# Altium footprint library CONN_HDR_2.54MM_RA.PcbLib: 63 footprints (part 4 of 5) (continued)
## HDRR_M_2X14 [mm] "Connector; Header; 14x2 Position"
height 7
pads (28):
  round 1.4 / inner round 1.4 / far side oval 1.4x2.2 hole 1: 1(-16.51,-1.27) 2(-16.51,1.27) 3(-13.97,-1.27) 4(-13.97,1.27) 5(-11.43,-1.27) 6(-11.43,1.27) 7(-8.89,-1.27) 8(-8.89,1.27) 9(-6.35,-1.27) 10(-6.35,1.27) 11(-3.81,-1.27) 12(-3.81,1.27) 13(-1.27,-1.27) 14(-1.27,1.27) 15(1.27,-1.27) 16(1.27,1.27) 17(3.81,-1.27) 18(3.81,1.27) 19(6.35,-1.27) 20(6.35,1.27) 21(8.89,-1.27) 22(8.89,1.27) 23(11.43,-1.27) 24(11.43,1.27) 25(13.97,-1.27) 26(13.97,1.27) 27(16.51,-1.27) 28(16.51,1.27)
Top Overlay:
  circle w0.2: c-18.34,-1.04 r0.2
  lines w0.2: -16.933,-5.31 -16.933,-13.197 -16.51,-13.62 -16.087,-13.197 -16.087,-5.31 ; -15.24,-5.31 -12.67,-5.31 ; -15.24,-2.7 -12.67,-2.7 ; -15.21,-5.31 -17.78,-5.31 -17.78,-2.7 -15.21,-2.7 ; -14.393,-5.31 -14.393,-13.197 -13.97,-13.62 -13.547,-13.197 -13.547,-5.31 ; -12.7,-5.31 -10.13,-5.31 ; -12.7,-2.7 -10.13,-2.7 ; -11.853,-5.31 -11.853,-13.197 -11.43,-13.62 -11.007,-13.197 -11.007,-5.31 ; -10.16,-5.31 -7.59,-5.31 ; -10.16,-2.7 -7.59,-2.7 ; -9.313,-5.31 -9.313,-13.197 -8.89,-13.62 -8.467,-13.197 -8.467,-5.31 ; -7.62,-5.31 -5.05,-5.31 ; -7.62,-2.7 -5.05,-2.7 ; -6.773,-5.31 -6.773,-13.197 -6.35,-13.62 -5.927,-13.197 -5.927,-5.31 ; -5.08,-5.31 -2.51,-5.31 ; -5.08,-2.7 -2.51,-2.7 ; -4.233,-5.31 -4.233,-13.197 -3.81,-13.62 -3.387,-13.197 -3.387,-5.31 ; -2.54,-5.31 0.03,-5.31 ; -2.54,-2.7 0.03,-2.7 ; -1.693,-5.31 -1.693,-13.197 -1.27,-13.62 -0.847,-13.197 -0.847,-5.31 ; 0,-5.31 2.57,-5.31 ; 0,-2.7 2.57,-2.7 ; 0.847,-5.31 0.847,-13.197 1.27,-13.62 1.693,-13.197 1.693,-5.31 ; 2.54,-5.31 5.11,-5.31 ; 2.54,-2.7 5.11,-2.7 ; 3.387,-5.31 3.387,-13.197 3.81,-13.62 4.233,-13.197 4.233,-5.31 ; 5.08,-5.31 7.65,-5.31 ; 5.08,-2.7 7.65,-2.7 ; 5.927,-5.31 5.927,-13.197 6.35,-13.62 6.773,-13.197 6.773,-5.31 ; 7.62,-5.31 10.19,-5.31 ; 7.62,-2.7 10.19,-2.7 ; 8.467,-5.31 8.467,-13.197 8.89,-13.62 9.313,-13.197 9.313,-5.31 ; 10.16,-5.31 12.73,-5.31 ; 10.16,-2.7 12.73,-2.7 ; 11.007,-5.31 11.007,-13.197 11.43,-13.62 11.853,-13.197 11.853,-5.31 ; 12.7,-5.31 15.27,-5.31 ; 12.7,-2.7 15.27,-2.7 ; 13.547,-5.31 13.547,-13.197 13.97,-13.62 14.393,-13.197 14.393,-5.31 ; 15.24,-5.31 17.81,-5.31 17.81,-2.7 15.24,-2.7 ; 16.087,-5.31 16.087,-13.197 16.51,-13.62 16.933,-13.197 16.933,-5.31
3D body "2x1 Male Pin Header Angle.STEP": height 5.04, standoff -2.96, extent -17.785,-13.34 -15.24,1.56
3D body "2x1 Male Pin Header Angle.STEP": height 5.04, standoff -2.96, extent -15.245,-13.34 -12.7,1.56
3D body "2x1 Male Pin Header Angle.STEP": height 5.04, standoff -2.96, extent -12.705,-13.34 -10.16,1.56
3D body "2x1 Male Pin Header Angle.STEP": height 5.04, standoff -2.96, extent -10.165,-13.34 -7.62,1.56
3D body "2x1 Male Pin Header Angle.STEP": height 5.04, standoff -2.96, extent -7.625,-13.34 -5.08,1.56
3D body "2x1 Male Pin Header Angle.STEP": height 5.04, standoff -2.96, extent -5.085,-13.34 -2.54,1.56
3D body "2x1 Male Pin Header Angle.STEP": height 5.04, standoff -2.96, extent -2.545,-13.34 0,1.56
3D body "2x1 Male Pin Header Angle.STEP": height 5.04, standoff -2.96, extent -0.005,-13.34 2.54,1.56
3D body "2x1 Male Pin Header Angle.STEP": height 5.04, standoff -2.96, extent 2.535,-13.34 5.08,1.56
3D body "2x1 Male Pin Header Angle.STEP": height 5.04, standoff -2.96, extent 5.075,-13.34 7.62,1.56
3D body "2x1 Male Pin Header Angle.STEP": height 5.04, standoff -2.96, extent 7.615,-13.34 10.16,1.56
3D body "2x1 Male Pin Header Angle.STEP": height 5.04, standoff -2.96, extent 10.155,-13.34 12.7,1.56
3D body "2x1 Male Pin Header Angle.STEP": height 5.04, standoff -2.96, extent 12.695,-13.34 15.24,1.56
3D body "2x1 Male Pin Header Angle.STEP": height 5.04, standoff -2.96, extent 15.235,-13.34 17.78,1.56

## HDRR_M_2X15 [mm] "Connector; Header; 15x2 Position"
height 0.001
pads (30):
  round 1.4 / inner round 1.4 / far side oval 1.4x2.2 hole 1: 1(-17.78,-1.27) 2(-17.78,1.27) 3(-15.24,-1.27) 4(-15.24,1.27) 5(-12.7,-1.27) 6(-12.7,1.27) 7(-10.16,-1.27) 8(-10.16,1.27) 9(-7.62,-1.27) 10(-7.62,1.27) 11(-5.08,-1.27) 12(-5.08,1.27) 13(-2.54,-1.27) 14(-2.54,1.27) 15(0,-1.27) 16(0,1.27) 17(2.54,-1.27) 18(2.54,1.27) 19(5.08,-1.27) 20(5.08,1.27) 21(7.62,-1.27) 22(7.62,1.27) 23(10.16,-1.27) 24(10.16,1.27) 25(12.7,-1.27) 26(12.7,1.27) 27(15.24,-1.27) 28(15.24,1.27) 29(17.78,-1.27) 30(17.78,1.27)
Top Overlay:
  circle w0.2: c-19.61,-1.04 r0.2
  lines w0.2: -18.203,-5.31 -18.203,-13.197 -17.78,-13.62 -17.357,-13.197 -17.357,-5.31 ; -16.51,-5.31 -13.94,-5.31 ; -16.51,-2.7 -13.94,-2.7 ; -16.48,-5.31 -19.05,-5.31 -19.05,-2.7 -16.48,-2.7 ; -15.663,-5.31 -15.663,-13.197 -15.24,-13.62 -14.817,-13.197 -14.817,-5.31 ; -13.97,-5.31 -11.4,-5.31 ; -13.97,-2.7 -11.4,-2.7 ; -13.123,-5.31 -13.123,-13.197 -12.7,-13.62 -12.277,-13.197 -12.277,-5.31 ; -11.43,-5.31 -8.86,-5.31 ; -11.43,-2.7 -8.86,-2.7 ; -10.583,-5.31 -10.583,-13.197 -10.16,-13.62 -9.737,-13.197 -9.737,-5.31 ; -8.89,-5.31 -6.32,-5.31 ; -8.89,-2.7 -6.32,-2.7 ; -8.043,-5.31 -8.043,-13.197 -7.62,-13.62 -7.197,-13.197 -7.197,-5.31 ; -6.35,-5.31 -3.78,-5.31 ; -6.35,-2.7 -3.78,-2.7 ; -5.503,-5.31 -5.503,-13.197 -5.08,-13.62 -4.657,-13.197 -4.657,-5.31 ; -3.81,-5.31 -1.24,-5.31 ; -3.81,-2.7 -1.24,-2.7 ; -2.963,-5.31 -2.963,-13.197 -2.54,-13.62 -2.117,-13.197 -2.117,-5.31 ; -1.27,-5.31 1.3,-5.31 ; -1.27,-2.7 1.3,-2.7 ; -0.423,-5.31 -0.423,-13.197 0,-13.62 0.423,-13.197 0.423,-5.31 ; 1.27,-5.31 3.84,-5.31 ; 1.27,-2.7 3.84,-2.7 ; 2.117,-5.31 2.117,-13.197 2.54,-13.62 2.963,-13.197 2.963,-5.31 ; 3.81,-5.31 6.38,-5.31 ; 3.81,-2.7 6.38,-2.7 ; 4.657,-5.31 4.657,-13.197 5.08,-13.62 5.503,-13.197 5.503,-5.31 ; 6.35,-5.31 8.92,-5.31 ; 6.35,-2.7 8.92,-2.7 ; 7.197,-5.31 7.197,-13.197 7.62,-13.62 8.043,-13.197 8.043,-5.31 ; 8.89,-5.31 11.46,-5.31 ; 8.89,-2.7 11.46,-2.7 ; 9.737,-5.31 9.737,-13.197 10.16,-13.62 10.583,-13.197 10.583,-5.31 ; 11.43,-5.31 14,-5.31 ; 11.43,-2.7 14,-2.7 ; 12.277,-5.31 12.277,-13.197 12.7,-13.62 13.123,-13.197 13.123,-5.31 ; 13.97,-5.31 16.54,-5.31 ; 13.97,-2.7 16.54,-2.7 ; 14.817,-5.31 14.817,-13.197 15.24,-13.62 15.663,-13.197 15.663,-5.31 ; 16.51,-5.31 19.08,-5.31 19.08,-2.7 16.51,-2.7 ; 17.357,-5.31 17.357,-13.197 17.78,-13.62 18.203,-13.197 18.203,-5.31
3D body "2x1 Male Pin Header Angle.STEP": height 5.04, standoff -2.96, extent -19.055,-13.34 -16.51,1.56
3D body "2x1 Male Pin Header Angle.STEP": height 5.04, standoff -2.96, extent -16.515,-13.34 -13.97,1.56
3D body "2x1 Male Pin Header Angle.STEP": height 5.04, standoff -2.96, extent -13.975,-13.34 -11.43,1.56
3D body "2x1 Male Pin Header Angle.STEP": height 5.04, standoff -2.96, extent -11.435,-13.34 -8.89,1.56
3D body "2x1 Male Pin Header Angle.STEP": height 5.04, standoff -2.96, extent -8.895,-13.34 -6.35,1.56
3D body "2x1 Male Pin Header Angle.STEP": height 5.04, standoff -2.96, extent -6.355,-13.34 -3.81,1.56
3D body "2x1 Male Pin Header Angle.STEP": height 5.04, standoff -2.96, extent -3.815,-13.34 -1.27,1.56
3D body "2x1 Male Pin Header Angle.STEP": height 5.04, standoff -2.96, extent -1.275,-13.34 1.27,1.56
3D body "2x1 Male Pin Header Angle.STEP": height 5.04, standoff -2.96, extent 1.265,-13.34 3.81,1.56
3D body "2x1 Male Pin Header Angle.STEP": height 5.04, standoff -2.96, extent 3.805,-13.34 6.35,1.56
3D body "2x1 Male Pin Header Angle.STEP": height 5.04, standoff -2.96, extent 6.345,-13.34 8.89,1.56
3D body "2x1 Male Pin Header Angle.STEP": height 5.04, standoff -2.96, extent 8.885,-13.34 11.43,1.56
3D body "2x1 Male Pin Header Angle.STEP": height 5.04, standoff -2.96, extent 11.425,-13.34 13.97,1.56
3D body "2x1 Male Pin Header Angle.STEP": height 5.04, standoff -2.96, extent 13.965,-13.34 16.51,1.56
3D body "2x1 Male Pin Header Angle.STEP": height 5.04, standoff -2.96, extent 16.505,-13.34 19.05,1.56

## HDRR_M_2X16 [mm] "Connector; Header; 16x2 Position"
height 7
pads (32):
  round 1.4 / inner round 1.4 / far side oval 1.4x2.2 hole 1: 1(-19.05,-1.27) 2(-19.05,1.27) 3(-16.51,-1.27) 4(-16.51,1.27) 5(-13.97,-1.27) 6(-13.97,1.27) 7(-11.43,-1.27) 8(-11.43,1.27) 9(-8.89,-1.27) 10(-8.89,1.27) 11(-6.35,-1.27) 12(-6.35,1.27) 13(-3.81,-1.27) 14(-3.81,1.27) 15(-1.27,-1.27) 16(-1.27,1.27) 17(1.27,-1.27) 18(1.27,1.27) 19(3.81,-1.27) 20(3.81,1.27) 21(6.35,-1.27) 22(6.35,1.27) 23(8.89,-1.27) 24(8.89,1.27) 25(11.43,-1.27) 26(11.43,1.27) 27(13.97,-1.27) 28(13.97,1.27) 29(16.51,-1.27) 30(16.51,1.27) 31(19.05,-1.27) 32(19.05,1.27)
Top Overlay:
  circle w0.2: c-20.88,-1.04 r0.2
  lines w0.2: -19.473,-5.31 -19.473,-13.197 -19.05,-13.62 -18.627,-13.197 -18.627,-5.31 ; -17.78,-5.31 -15.21,-5.31 ; -17.78,-2.7 -15.21,-2.7 ; -17.75,-5.31 -20.32,-5.31 -20.32,-2.7 -17.75,-2.7 ; -16.933,-5.31 -16.933,-13.197 -16.51,-13.62 -16.087,-13.197 -16.087,-5.31 ; -15.24,-5.31 -12.67,-5.31 ; -15.24,-2.7 -12.67,-2.7 ; -14.393,-5.31 -14.393,-13.197 -13.97,-13.62 -13.547,-13.197 -13.547,-5.31 ; -12.7,-5.31 -10.13,-5.31 ; -12.7,-2.7 -10.13,-2.7 ; -11.853,-5.31 -11.853,-13.197 -11.43,-13.62 -11.007,-13.197 -11.007,-5.31 ; -10.16,-5.31 -7.59,-5.31 ; -10.16,-2.7 -7.59,-2.7 ; -9.313,-5.31 -9.313,-13.197 -8.89,-13.62 -8.467,-13.197 -8.467,-5.31 ; -7.62,-5.31 -5.05,-5.31 ; -7.62,-2.7 -5.05,-2.7 ; -6.773,-5.31 -6.773,-13.197 -6.35,-13.62 -5.927,-13.197 -5.927,-5.31 ; -5.08,-5.31 -2.51,-5.31 ; -5.08,-2.7 -2.51,-2.7 ; -4.233,-5.31 -4.233,-13.197 -3.81,-13.62 -3.387,-13.197 -3.387,-5.31 ; -2.54,-5.31 0.03,-5.31 ; -2.54,-2.7 0.03,-2.7 ; -1.693,-5.31 -1.693,-13.197 -1.27,-13.62 -0.847,-13.197 -0.847,-5.31 ; 0,-5.31 2.57,-5.31 ; 0,-2.7 2.57,-2.7 ; 0.847,-5.31 0.847,-13.197 1.27,-13.62 1.693,-13.197 1.693,-5.31 ; 2.54,-5.31 5.11,-5.31 ; 2.54,-2.7 5.11,-2.7 ; 3.387,-5.31 3.387,-13.197 3.81,-13.62 4.233,-13.197 4.233,-5.31 ; 5.08,-5.31 7.65,-5.31 ; 5.08,-2.7 7.65,-2.7 ; 5.927,-5.31 5.927,-13.197 6.35,-13.62 6.773,-13.197 6.773,-5.31 ; 7.62,-5.31 10.19,-5.31 ; 7.62,-2.7 10.19,-2.7 ; 8.467,-5.31 8.467,-13.197 8.89,-13.62 9.313,-13.197 9.313,-5.31 ; 10.16,-5.31 12.73,-5.31 ; 10.16,-2.7 12.73,-2.7 ; 11.007,-5.31 11.007,-13.197 11.43,-13.62 11.853,-13.197 11.853,-5.31 ; 12.7,-5.31 15.27,-5.31 ; 12.7,-2.7 15.27,-2.7 ; 13.547,-5.31 13.547,-13.197 13.97,-13.62 14.393,-13.197 14.393,-5.31 ; 15.24,-5.31 17.81,-5.31 ; 15.24,-2.7 17.81,-2.7 ; 16.087,-5.31 16.087,-13.197 16.51,-13.62 16.933,-13.197 16.933,-5.31 ; 17.78,-5.31 20.35,-5.31 20.35,-2.7 17.78,-2.7 ; 18.627,-5.31 18.627,-13.197 19.05,-13.62 19.473,-13.197 19.473,-5.31
3D body "2x1 Male Pin Header Angle.STEP": height 5.04, standoff -2.96, extent -20.325,-13.34 -17.78,1.56
3D body "2x1 Male Pin Header Angle.STEP": height 5.04, standoff -2.96, extent -17.785,-13.34 -15.24,1.56
3D body "2x1 Male Pin Header Angle.STEP": height 5.04, standoff -2.96, extent -15.245,-13.34 -12.7,1.56
3D body "2x1 Male Pin Header Angle.STEP": height 5.04, standoff -2.96, extent -12.705,-13.34 -10.16,1.56
3D body "2x1 Male Pin Header Angle.STEP": height 5.04, standoff -2.96, extent -10.165,-13.34 -7.62,1.56
3D body "2x1 Male Pin Header Angle.STEP": height 5.04, standoff -2.96, extent -7.625,-13.34 -5.08,1.56
3D body "2x1 Male Pin Header Angle.STEP": height 5.04, standoff -2.96, extent -5.085,-13.34 -2.54,1.56
3D body "2x1 Male Pin Header Angle.STEP": height 5.04, standoff -2.96, extent -2.545,-13.34 0,1.56
3D body "2x1 Male Pin Header Angle.STEP": height 5.04, standoff -2.96, extent -0.005,-13.34 2.54,1.56
3D body "2x1 Male Pin Header Angle.STEP": height 5.04, standoff -2.96, extent 2.535,-13.34 5.08,1.56
3D body "2x1 Male Pin Header Angle.STEP": height 5.04, standoff -2.96, extent 5.075,-13.34 7.62,1.56
3D body "2x1 Male Pin Header Angle.STEP": height 5.04, standoff -2.96, extent 7.615,-13.34 10.16,1.56
3D body "2x1 Male Pin Header Angle.STEP": height 5.04, standoff -2.96, extent 10.155,-13.34 12.7,1.56
3D body "2x1 Male Pin Header Angle.STEP": height 5.04, standoff -2.96, extent 12.695,-13.34 15.24,1.56
3D body "2x1 Male Pin Header Angle.STEP": height 5.04, standoff -2.96, extent 15.235,-13.34 17.78,1.56
3D body "2x1 Male Pin Header Angle.STEP": height 5.04, standoff -2.96, extent 17.775,-13.34 20.32,1.56

## HDRR_M_2X17 [mm] "Connector; Header; 17x2 Position"
height 7
pads (34):
  round 1.4 / inner round 1.4 / far side oval 1.4x2.2 hole 1: 1(-20.32,-1.27) 2(-20.32,1.27) 3(-17.78,-1.27) 4(-17.78,1.27) 5(-15.24,-1.27) 6(-15.24,1.27) 7(-12.7,-1.27) 8(-12.7,1.27) 9(-10.16,-1.27) 10(-10.16,1.27) 11(-7.62,-1.27) 12(-7.62,1.27) 13(-5.08,-1.27) 14(-5.08,1.27) 15(-2.54,-1.27) 16(-2.54,1.27) 17(0,-1.27) 18(0,1.27) 19(2.54,-1.27) 20(2.54,1.27) 21(5.08,-1.27) 22(5.08,1.27) 23(7.62,-1.27) 24(7.62,1.27) 25(10.16,-1.27) 26(10.16,1.27) 27(12.7,-1.27) 28(12.7,1.27) 29(15.24,-1.27) 30(15.24,1.27) 31(17.78,-1.27) 32(17.78,1.27) 33(20.32,-1.27) 34(20.32,1.27)
Top Overlay:
  circle w0.2: c-22.15,-1.04 r0.2
  lines w0.2: -20.743,-5.31 -20.743,-13.197 -20.32,-13.62 -19.897,-13.197 -19.897,-5.31 ; -19.05,-5.31 -16.48,-5.31 ; -19.05,-2.7 -16.48,-2.7 ; -19.02,-5.31 -21.59,-5.31 -21.59,-2.7 -19.02,-2.7 ; -18.203,-5.31 -18.203,-13.197 -17.78,-13.62 -17.357,-13.197 -17.357,-5.31 ; -16.51,-5.31 -13.94,-5.31 ; -16.51,-2.7 -13.94,-2.7 ; -15.663,-5.31 -15.663,-13.197 -15.24,-13.62 -14.817,-13.197 -14.817,-5.31 ; -13.97,-5.31 -11.4,-5.31 ; -13.97,-2.7 -11.4,-2.7 ; -13.123,-5.31 -13.123,-13.197 -12.7,-13.62 -12.277,-13.197 -12.277,-5.31 ; -11.43,-5.31 -8.86,-5.31 ; -11.43,-2.7 -8.86,-2.7 ; -10.583,-5.31 -10.583,-13.197 -10.16,-13.62 -9.737,-13.197 -9.737,-5.31 ; -8.89,-5.31 -6.32,-5.31 ; -8.89,-2.7 -6.32,-2.7 ; -8.043,-5.31 -8.043,-13.197 -7.62,-13.62 -7.197,-13.197 -7.197,-5.31 ; -6.35,-5.31 -3.78,-5.31 ; -6.35,-2.7 -3.78,-2.7 ; -5.503,-5.31 -5.503,-13.197 -5.08,-13.62 -4.657,-13.197 -4.657,-5.31 ; -3.81,-5.31 -1.24,-5.31 ; -3.81,-2.7 -1.24,-2.7 ; -2.963,-5.31 -2.963,-13.197 -2.54,-13.62 -2.117,-13.197 -2.117,-5.31 ; -1.27,-5.31 1.3,-5.31 ; -1.27,-2.7 1.3,-2.7 ; -0.423,-5.31 -0.423,-13.197 0,-13.62 0.423,-13.197 0.423,-5.31 ; 1.27,-5.31 3.84,-5.31 ; 1.27,-2.7 3.84,-2.7 ; 2.117,-5.31 2.117,-13.197 2.54,-13.62 2.963,-13.197 2.963,-5.31 ; 3.81,-5.31 6.38,-5.31 ; 3.81,-2.7 6.38,-2.7 ; 4.657,-5.31 4.657,-13.197 5.08,-13.62 5.503,-13.197 5.503,-5.31 ; 6.35,-5.31 8.92,-5.31 ; 6.35,-2.7 8.92,-2.7 ; 7.197,-5.31 7.197,-13.197 7.62,-13.62 8.043,-13.197 8.043,-5.31 ; 8.89,-5.31 11.46,-5.31 ; 8.89,-2.7 11.46,-2.7 ; 9.737,-5.31 9.737,-13.197 10.16,-13.62 10.583,-13.197 10.583,-5.31 ; 11.43,-5.31 14,-5.31 ; 11.43,-2.7 14,-2.7 ; 12.277,-5.31 12.277,-13.197 12.7,-13.62 13.123,-13.197 13.123,-5.31 ; 13.97,-5.31 16.54,-5.31 ; 13.97,-2.7 16.54,-2.7 ; 14.817,-5.31 14.817,-13.197 15.24,-13.62 15.663,-13.197 15.663,-5.31 ; 16.51,-5.31 19.08,-5.31 ; 16.51,-2.7 19.08,-2.7 ; 17.357,-5.31 17.357,-13.197 17.78,-13.62 18.203,-13.197 18.203,-5.31 ; 19.05,-5.31 21.62,-5.31 21.62,-2.7 19.05,-2.7 ; 19.897,-5.31 19.897,-13.197 20.32,-13.62 20.743,-13.197 20.743,-5.31
3D body "2x1 Male Pin Header Angle.STEP": height 5.04, standoff -2.96, extent -21.595,-13.34 -19.05,1.56
3D body "2x1 Male Pin Header Angle.STEP": height 5.04, standoff -2.96, extent -19.055,-13.34 -16.51,1.56
3D body "2x1 Male Pin Header Angle.STEP": height 5.04, standoff -2.96, extent -16.515,-13.34 -13.97,1.56
3D body "2x1 Male Pin Header Angle.STEP": height 5.04, standoff -2.96, extent -13.975,-13.34 -11.43,1.56
3D body "2x1 Male Pin Header Angle.STEP": height 5.04, standoff -2.96, extent -11.435,-13.34 -8.89,1.56
3D body "2x1 Male Pin Header Angle.STEP": height 5.04, standoff -2.96, extent -8.895,-13.34 -6.35,1.56
3D body "2x1 Male Pin Header Angle.STEP": height 5.04, standoff -2.96, extent -6.355,-13.34 -3.81,1.56
3D body "2x1 Male Pin Header Angle.STEP": height 5.04, standoff -2.96, extent -3.815,-13.34 -1.27,1.56
3D body "2x1 Male Pin Header Angle.STEP": height 5.04, standoff -2.96, extent -1.275,-13.34 1.27,1.56
3D body "2x1 Male Pin Header Angle.STEP": height 5.04, standoff -2.96, extent 1.265,-13.34 3.81,1.56
3D body "2x1 Male Pin Header Angle.STEP": height 5.04, standoff -2.96, extent 3.805,-13.34 6.35,1.56
3D body "2x1 Male Pin Header Angle.STEP": height 5.04, standoff -2.96, extent 6.345,-13.34 8.89,1.56
3D body "2x1 Male Pin Header Angle.STEP": height 5.04, standoff -2.96, extent 8.885,-13.34 11.43,1.56
3D body "2x1 Male Pin Header Angle.STEP": height 5.04, standoff -2.96, extent 11.425,-13.34 13.97,1.56
3D body "2x1 Male Pin Header Angle.STEP": height 5.04, standoff -2.96, extent 13.965,-13.34 16.51,1.56
3D body "2x1 Male Pin Header Angle.STEP": height 5.04, standoff -2.96, extent 16.505,-13.34 19.05,1.56
3D body "2x1 Male Pin Header Angle.STEP": height 5.04, standoff -2.96, extent 19.045,-13.34 21.59,1.56

## HDRR_M_2X18 [mm] "Connector; Header; 18x2 Position"
height 7
pads (36):
  round 1.4 / inner round 1.4 / far side oval 1.4x2.2 hole 1: 1(-21.59,-1.27) 2(-21.59,1.27) 3(-19.05,-1.27) 4(-19.05,1.27) 5(-16.51,-1.27) 6(-16.51,1.27) 7(-13.97,-1.27) 8(-13.97,1.27) 9(-11.43,-1.27) 10(-11.43,1.27) 11(-8.89,-1.27) 12(-8.89,1.27) 13(-6.35,-1.27) 14(-6.35,1.27) 15(-3.81,-1.27) 16(-3.81,1.27) 17(-1.27,-1.27) 18(-1.27,1.27) 19(1.27,-1.27) 20(1.27,1.27) 21(3.81,-1.27) 22(3.81,1.27) 23(6.35,-1.27) 24(6.35,1.27) 25(8.89,-1.27) 26(8.89,1.27) 27(11.43,-1.27) 28(11.43,1.27) 29(13.97,-1.27) 30(13.97,1.27) 31(16.51,-1.27) 32(16.51,1.27) 33(19.05,-1.27) 34(19.05,1.27) 35(21.59,-1.27) 36(21.59,1.27)
Top Overlay:
  circle w0.2: c-23.42,-1.04 r0.2
  lines w0.2: -22.013,-5.31 -22.013,-13.197 -21.59,-13.62 -21.167,-13.197 -21.167,-5.31 ; -20.32,-5.31 -17.75,-5.31 ; -20.32,-2.7 -17.75,-2.7 ; -20.29,-5.31 -22.86,-5.31 -22.86,-2.7 -20.29,-2.7 ; -19.473,-5.31 -19.473,-13.197 -19.05,-13.62 -18.627,-13.197 -18.627,-5.31 ; -17.78,-5.31 -15.21,-5.31 ; -17.78,-2.7 -15.21,-2.7 ; -16.933,-5.31 -16.933,-13.197 -16.51,-13.62 -16.087,-13.197 -16.087,-5.31 ; -15.24,-5.31 -12.67,-5.31 ; -15.24,-2.7 -12.67,-2.7 ; -14.393,-5.31 -14.393,-13.197 -13.97,-13.62 -13.547,-13.197 -13.547,-5.31 ; -12.7,-5.31 -10.13,-5.31 ; -12.7,-2.7 -10.13,-2.7 ; -11.853,-5.31 -11.853,-13.197 -11.43,-13.62 -11.007,-13.197 -11.007,-5.31 ; -10.16,-5.31 -7.59,-5.31 ; -10.16,-2.7 -7.59,-2.7 ; -9.313,-5.31 -9.313,-13.197 -8.89,-13.62 -8.467,-13.197 -8.467,-5.31 ; -7.62,-5.31 -5.05,-5.31 ; -7.62,-2.7 -5.05,-2.7 ; -6.773,-5.31 -6.773,-13.197 -6.35,-13.62 -5.927,-13.197 -5.927,-5.31 ; -5.08,-5.31 -2.51,-5.31 ; -5.08,-2.7 -2.51,-2.7 ; -4.233,-5.31 -4.233,-13.197 -3.81,-13.62 -3.387,-13.197 -3.387,-5.31 ; -2.54,-5.31 0.03,-5.31 ; -2.54,-2.7 0.03,-2.7 ; -1.693,-5.31 -1.693,-13.197 -1.27,-13.62 -0.847,-13.197 -0.847,-5.31 ; 0,-5.31 2.57,-5.31 ; 0,-2.7 2.57,-2.7 ; 0.847,-5.31 0.847,-13.197 1.27,-13.62 1.693,-13.197 1.693,-5.31 ; 2.54,-5.31 5.11,-5.31 ; 2.54,-2.7 5.11,-2.7 ; 3.387,-5.31 3.387,-13.197 3.81,-13.62 4.233,-13.197 4.233,-5.31 ; 5.08,-5.31 7.65,-5.31 ; 5.08,-2.7 7.65,-2.7 ; 5.927,-5.31 5.927,-13.197 6.35,-13.62 6.773,-13.197 6.773,-5.31 ; 7.62,-5.31 10.19,-5.31 ; 7.62,-2.7 10.19,-2.7 ; 8.467,-5.31 8.467,-13.197 8.89,-13.62 9.313,-13.197 9.313,-5.31 ; 10.16,-5.31 12.73,-5.31 ; 10.16,-2.7 12.73,-2.7 ; 11.007,-5.31 11.007,-13.197 11.43,-13.62 11.853,-13.197 11.853,-5.31 ; 12.7,-5.31 15.27,-5.31 ; 12.7,-2.7 15.27,-2.7 ; 13.547,-5.31 13.547,-13.197 13.97,-13.62 14.393,-13.197 14.393,-5.31 ; 15.24,-5.31 17.81,-5.31 ; 15.24,-2.7 17.81,-2.7 ; 16.087,-5.31 16.087,-13.197 16.51,-13.62 16.933,-13.197 16.933,-5.31 ; 17.78,-5.31 20.35,-5.31 ; 17.78,-2.7 20.35,-2.7 ; 18.627,-5.31 18.627,-13.197 19.05,-13.62 19.473,-13.197 19.473,-5.31 ; 20.32,-5.31 22.89,-5.31 22.89,-2.7 20.32,-2.7 ; 21.167,-5.31 21.167,-13.197 21.59,-13.62 22.013,-13.197 22.013,-5.31
3D body "2x1 Male Pin Header Angle.STEP": height 5.04, standoff -2.96, extent 20.315,-13.34 22.86,1.56
3D body "2x1 Male Pin Header Angle.STEP": height 5.04, standoff -2.96, extent -22.865,-13.34 -20.32,1.56
3D body "2x1 Male Pin Header Angle.STEP": height 5.04, standoff -2.96, extent -20.325,-13.34 -17.78,1.56
3D body "2x1 Male Pin Header Angle.STEP": height 5.04, standoff -2.96, extent -17.785,-13.34 -15.24,1.56
3D body "2x1 Male Pin Header Angle.STEP": height 5.04, standoff -2.96, extent -15.245,-13.34 -12.7,1.56
3D body "2x1 Male Pin Header Angle.STEP": height 5.04, standoff -2.96, extent -12.705,-13.34 -10.16,1.56
3D body "2x1 Male Pin Header Angle.STEP": height 5.04, standoff -2.96, extent -10.165,-13.34 -7.62,1.56
3D body "2x1 Male Pin Header Angle.STEP": height 5.04, standoff -2.96, extent -7.625,-13.34 -5.08,1.56
3D body "2x1 Male Pin Header Angle.STEP": height 5.04, standoff -2.96, extent -5.085,-13.34 -2.54,1.56
3D body "2x1 Male Pin Header Angle.STEP": height 5.04, standoff -2.96, extent -2.545,-13.34 0,1.56
3D body "2x1 Male Pin Header Angle.STEP": height 5.04, standoff -2.96, extent -0.005,-13.34 2.54,1.56
3D body "2x1 Male Pin Header Angle.STEP": height 5.04, standoff -2.96, extent 2.535,-13.34 5.08,1.56
3D body "2x1 Male Pin Header Angle.STEP": height 5.04, standoff -2.96, extent 5.075,-13.34 7.62,1.56
3D body "2x1 Male Pin Header Angle.STEP": height 5.04, standoff -2.96, extent 7.615,-13.34 10.16,1.56
3D body "2x1 Male Pin Header Angle.STEP": height 5.04, standoff -2.96, extent 10.155,-13.34 12.7,1.56
3D body "2x1 Male Pin Header Angle.STEP": height 5.04, standoff -2.96, extent 12.695,-13.34 15.24,1.56
3D body "2x1 Male Pin Header Angle.STEP": height 5.04, standoff -2.96, extent 15.235,-13.34 17.78,1.56
3D body "2x1 Male Pin Header Angle.STEP": height 5.04, standoff -2.96, extent 17.775,-13.34 20.32,1.56

## HDRR_M_2X19 [mm] "Connector; Header; 19x2 Position"
height 7
pads (38):
  round 1.4 / inner round 1.4 / far side oval 1.4x2.2 hole 1: 1(-22.86,-1.27) 2(-22.86,1.27) 3(-20.32,-1.27) 4(-20.32,1.27) 5(-17.78,-1.27) 6(-17.78,1.27) 7(-15.24,-1.27) 8(-15.24,1.27) 9(-12.7,-1.27) 10(-12.7,1.27) 11(-10.16,-1.27) 12(-10.16,1.27) 13(-7.62,-1.27) 14(-7.62,1.27) 15(-5.08,-1.27) 16(-5.08,1.27) 17(-2.54,-1.27) 18(-2.54,1.27) 19(0,-1.27) 20(0,1.27) 21(2.54,-1.27) 22(2.54,1.27) 23(5.08,-1.27) 24(5.08,1.27) 25(7.62,-1.27) 26(7.62,1.27) 27(10.16,-1.27) 28(10.16,1.27) 29(12.7,-1.27) 30(12.7,1.27) 31(15.24,-1.27) 32(15.24,1.27) 33(17.78,-1.27) 34(17.78,1.27) 35(20.32,-1.27) 36(20.32,1.27) 37(22.86,-1.27) 38(22.86,1.27)
Top Overlay:
  circle w0.2: c-24.69,-1.04 r0.2
  lines w0.2: -23.283,-5.31 -23.283,-13.197 -22.86,-13.62 -22.437,-13.197 -22.437,-5.31 ; -21.59,-5.31 -19.02,-5.31 ; -21.59,-2.7 -19.02,-2.7 ; -21.56,-5.31 -24.13,-5.31 -24.13,-2.7 -21.56,-2.7 ; -20.743,-5.31 -20.743,-13.197 -20.32,-13.62 -19.897,-13.197 -19.897,-5.31 ; -19.05,-5.31 -16.48,-5.31 ; -19.05,-2.7 -16.48,-2.7 ; -18.203,-5.31 -18.203,-13.197 -17.78,-13.62 -17.357,-13.197 -17.357,-5.31 ; -16.51,-5.31 -13.94,-5.31 ; -16.51,-2.7 -13.94,-2.7 ; -15.663,-5.31 -15.663,-13.197 -15.24,-13.62 -14.817,-13.197 -14.817,-5.31 ; -13.97,-5.31 -11.4,-5.31 ; -13.97,-2.7 -11.4,-2.7 ; -13.123,-5.31 -13.123,-13.197 -12.7,-13.62 -12.277,-13.197 -12.277,-5.31 ; -11.43,-5.31 -8.86,-5.31 ; -11.43,-2.7 -8.86,-2.7 ; -10.583,-5.31 -10.583,-13.197 -10.16,-13.62 -9.737,-13.197 -9.737,-5.31 ; -8.89,-5.31 -6.32,-5.31 ; -8.89,-2.7 -6.32,-2.7 ; -8.043,-5.31 -8.043,-13.197 -7.62,-13.62 -7.197,-13.197 -7.197,-5.31 ; -6.35,-5.31 -3.78,-5.31 ; -6.35,-2.7 -3.78,-2.7 ; -5.503,-5.31 -5.503,-13.197 -5.08,-13.62 -4.657,-13.197 -4.657,-5.31 ; -3.81,-5.31 -1.24,-5.31 ; -3.81,-2.7 -1.24,-2.7 ; -2.963,-5.31 -2.963,-13.197 -2.54,-13.62 -2.117,-13.197 -2.117,-5.31 ; -1.27,-5.31 1.3,-5.31 ; -1.27,-2.7 1.3,-2.7 ; -0.423,-5.31 -0.423,-13.197 0,-13.62 0.423,-13.197 0.423,-5.31 ; 1.27,-5.31 3.84,-5.31 ; 1.27,-2.7 3.84,-2.7 ; 2.117,-5.31 2.117,-13.197 2.54,-13.62 2.963,-13.197 2.963,-5.31 ; 3.81,-5.31 6.38,-5.31 ; 3.81,-2.7 6.38,-2.7 ; 4.657,-5.31 4.657,-13.197 5.08,-13.62 5.503,-13.197 5.503,-5.31 ; 6.35,-5.31 8.92,-5.31 ; 6.35,-2.7 8.92,-2.7 ; 7.197,-5.31 7.197,-13.197 7.62,-13.62 8.043,-13.197 8.043,-5.31 ; 8.89,-5.31 11.46,-5.31 ; 8.89,-2.7 11.46,-2.7 ; 9.737,-5.31 9.737,-13.197 10.16,-13.62 10.583,-13.197 10.583,-5.31 ; 11.43,-5.31 14,-5.31 ; 11.43,-2.7 14,-2.7 ; 12.277,-5.31 12.277,-13.197 12.7,-13.62 13.123,-13.197 13.123,-5.31 ; 13.97,-5.31 16.54,-5.31 ; 13.97,-2.7 16.54,-2.7 ; 14.817,-5.31 14.817,-13.197 15.24,-13.62 15.663,-13.197 15.663,-5.31 ; 16.51,-5.31 19.08,-5.31 ; 16.51,-2.7 19.08,-2.7 ; 17.357,-5.31 17.357,-13.197 17.78,-13.62 18.203,-13.197 18.203,-5.31 ; 19.05,-5.31 21.62,-5.31 ; 19.05,-2.7 21.62,-2.7 ; 19.897,-5.31 19.897,-13.197 20.32,-13.62 20.743,-13.197 20.743,-5.31 ; 21.59,-5.31 24.16,-5.31 24.16,-2.7 21.59,-2.7 ; 22.437,-5.31 22.437,-13.197 22.86,-13.62 23.283,-13.197 23.283,-5.31
3D body "2x1 Male Pin Header Angle.STEP": height 5.04, standoff -2.96, extent 21.585,-13.34 24.13,1.56
3D body "2x1 Male Pin Header Angle.STEP": height 5.04, standoff -2.96, extent 19.045,-13.34 21.59,1.56
3D body "2x1 Male Pin Header Angle.STEP": height 5.04, standoff -2.96, extent -24.135,-13.34 -21.59,1.56
3D body "2x1 Male Pin Header Angle.STEP": height 5.04, standoff -2.96, extent -21.595,-13.34 -19.05,1.56
3D body "2x1 Male Pin Header Angle.STEP": height 5.04, standoff -2.96, extent -19.055,-13.34 -16.51,1.56
3D body "2x1 Male Pin Header Angle.STEP": height 5.04, standoff -2.96, extent -16.515,-13.34 -13.97,1.56
3D body "2x1 Male Pin Header Angle.STEP": height 5.04, standoff -2.96, extent -13.975,-13.34 -11.43,1.56
3D body "2x1 Male Pin Header Angle.STEP": height 5.04, standoff -2.96, extent -11.435,-13.34 -8.89,1.56
3D body "2x1 Male Pin Header Angle.STEP": height 5.04, standoff -2.96, extent -8.895,-13.34 -6.35,1.56
3D body "2x1 Male Pin Header Angle.STEP": height 5.04, standoff -2.96, extent -6.355,-13.34 -3.81,1.56
3D body "2x1 Male Pin Header Angle.STEP": height 5.04, standoff -2.96, extent -3.815,-13.34 -1.27,1.56
3D body "2x1 Male Pin Header Angle.STEP": height 5.04, standoff -2.96, extent -1.275,-13.34 1.27,1.56
3D body "2x1 Male Pin Header Angle.STEP": height 5.04, standoff -2.96, extent 1.265,-13.34 3.81,1.56
3D body "2x1 Male Pin Header Angle.STEP": height 5.04, standoff -2.96, extent 3.805,-13.34 6.35,1.56
3D body "2x1 Male Pin Header Angle.STEP": height 5.04, standoff -2.96, extent 6.345,-13.34 8.89,1.56
3D body "2x1 Male Pin Header Angle.STEP": height 5.04, standoff -2.96, extent 8.885,-13.34 11.43,1.56
3D body "2x1 Male Pin Header Angle.STEP": height 5.04, standoff -2.96, extent 11.425,-13.34 13.97,1.56
3D body "2x1 Male Pin Header Angle.STEP": height 5.04, standoff -2.96, extent 13.965,-13.34 16.51,1.56
3D body "2x1 Male Pin Header Angle.STEP": height 5.04, standoff -2.96, extent 16.505,-13.34 19.05,1.56